# Altium footprint library IC.PcbLib: 386 footprints (part 23 of 30)
Each footprint in its own frame and in the unit in brackets; x right, y up, seen from the top. Pads: shape width x height; smd on the part's side, far side on the other; paste and mask are expansions set on the pad; w line width, h text height; cw(c..) or ccw(c..) is an arc to the next point about the centre after c.
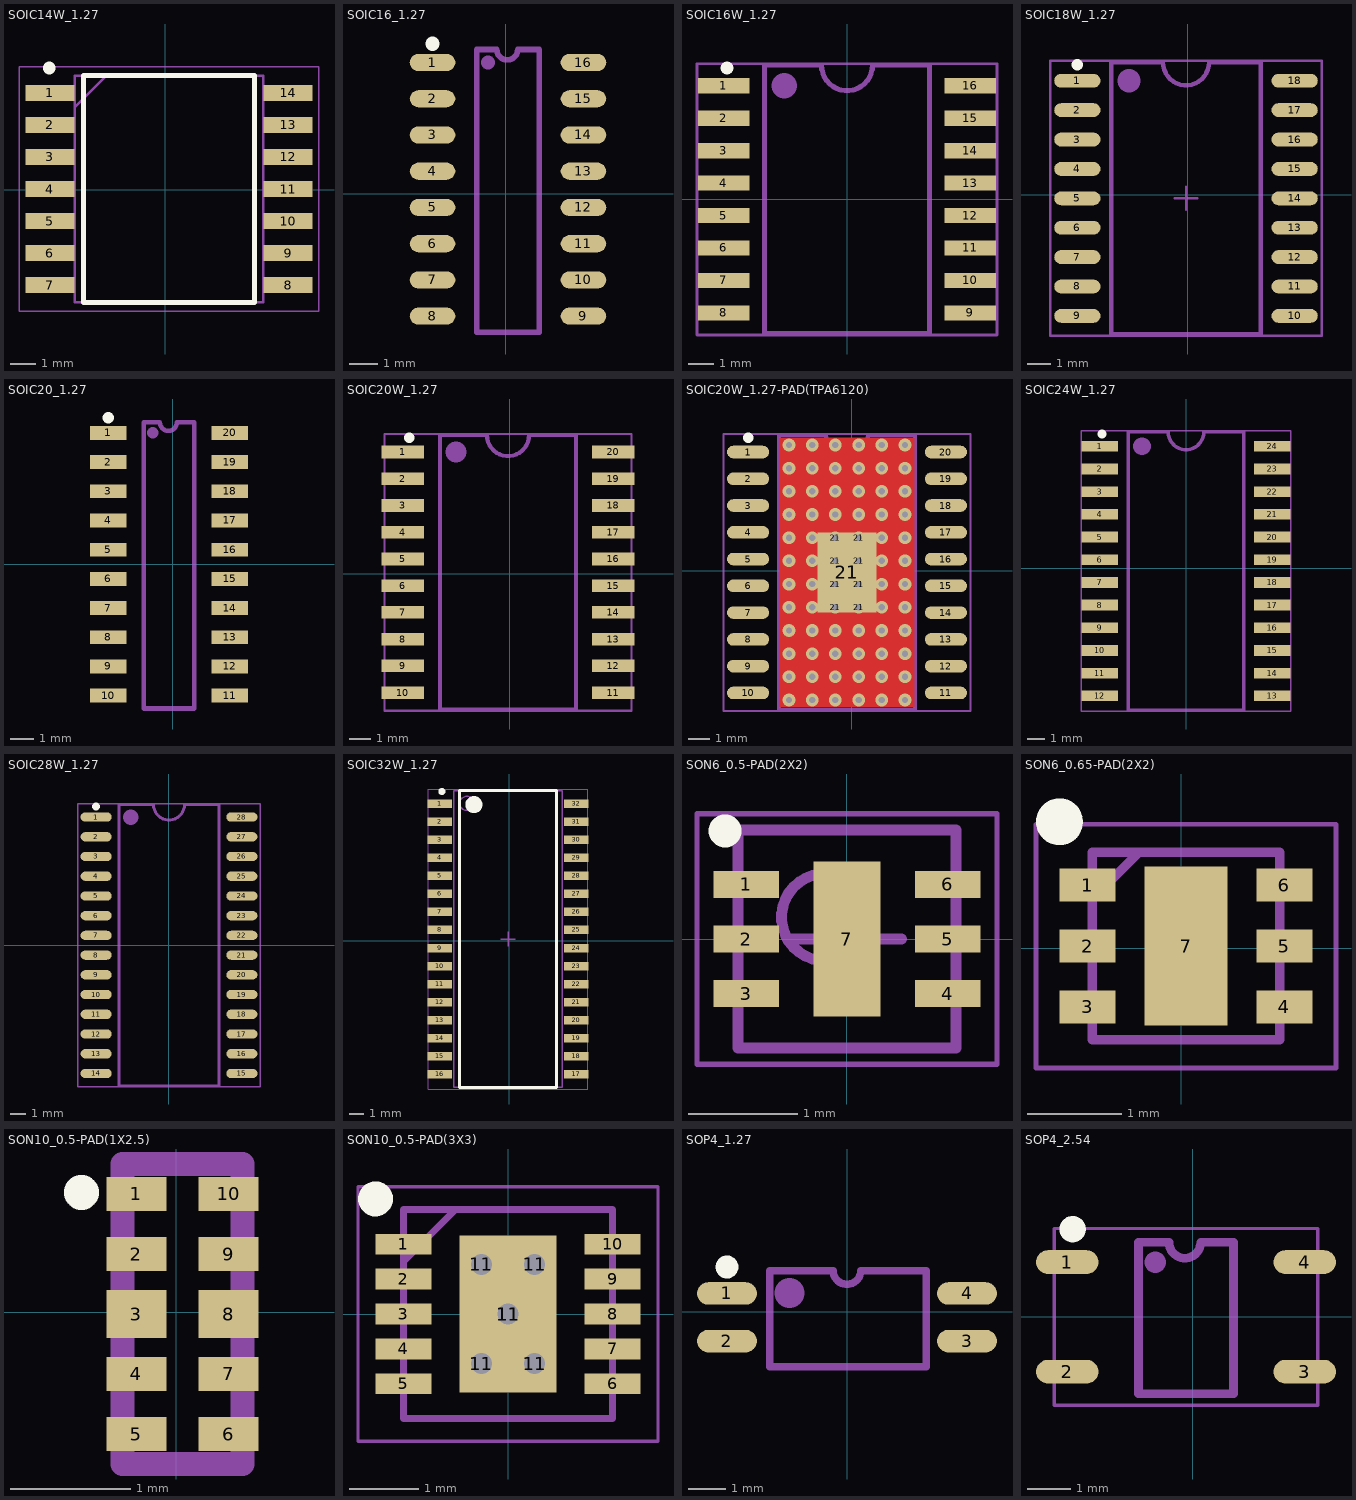
[diagram p22: the footprints below, top view; thin cyan lines are the x and y axes]

## SOIC14W_1.27 [mm]
pads (14):
  rect 1.954x0.65 smd: 1(-4.571,3.835) 2(-4.571,2.565) 3(-4.571,1.295) 4(-4.571,0.025) 5(-4.571,-1.245) 6(-4.571,-2.515) 7(-4.571,-3.785) 8(4.875,-3.785) 9(4.875,-2.515) 10(4.875,-1.245) 11(4.875,0.025) 12(4.875,1.295) 13(4.875,2.565) 14(4.875,3.835)
Top Overlay:
  lines w0.2: -3.244,-4.471 3.548,-4.471 3.548,4.521 -3.244,4.521 -3.244,-4.471
  lines w0.5: -4.597,4.822 -4.597,4.823
Mechanical 13:
  lines w0.1: -3.594,3.251 -2.324,4.521 ; -3.594,-4.471 3.898,-4.471 3.898,4.521 -3.594,4.521 -3.594,-4.471
Mechanical 15:
  lines w0.05: -5.798,-4.823 6.102,-4.823 6.102,4.873 -5.798,4.873 -5.798,-4.823
3D body "LM2574M-3.3_NOPB.stp": height 2.64, standoff 0, extent -5.01,-4.47 5.315,4.521

## SOIC16_1.27 [mm]
pads (16):
  oval 1.6x0.6 smd: 1(-2.569,4.597) 2(-2.569,3.327) 3(-2.569,2.057) 4(-2.569,0.787) 5(-2.569,-0.483) 6(-2.569,-1.753) 7(-2.569,-3.023) 8(-2.569,-4.293) 9(2.721,-4.293) 10(2.721,-3.023) 11(2.721,-1.753) 12(2.721,-0.483) 13(2.721,0.787) 14(2.721,2.057) 15(2.721,3.327) 16(2.721,4.597)
Top Overlay:
  lines w0.5: -2.569,5.258 -2.568,5.257
Mechanical 15:
  lines w0.2: 0.416,5.055 cw(c0.049,5.055) -0.318,5.055 -1.024,5.055 -1.024,-4.851 1.176,-4.851 1.176,5.055 0.443,5.055
  lines w0.5: -0.628,4.598 -0.628,4.597
3D body "SOIC-16-1.STEP": height 1.4, standoff 0, extent -2.908,-4.775 3.092,5.125

## SOIC16W_1.27 [mm]
pads (16):
  rect 2x0.6 smd: 1(-4.822,4.445) 2(-4.822,3.175) 3(-4.822,1.905) 4(-4.822,0.635) 5(-4.822,-0.635) 6(-4.822,-1.905) 7(-4.822,-3.175) 8(-4.822,-4.445) 9(4.822,-4.445) 10(4.822,-3.175) 11(4.822,-1.905) 12(4.822,-0.635) 13(4.822,0.635) 14(4.822,1.905) 15(4.822,3.175) 16(4.822,4.445)
Top Overlay:
  lines w0.5: -4.695,5.131 -4.695,5.132
Mechanical 15:
  lines w0.1: -5.867,-5.309 -5.867,5.309 5.867,5.309 5.867,-5.309 -5.867,-5.309
  lines w0.2: -3.23,-5.25 3.23,-5.25 3.23,5.25 1,5.25 cw(c0,5.25) -1,5.25 -3.23,5.25 -3.23,-5.25
  lines w1: -2.46,4.445 -2.46,4.445
3D body "SOIC16W-1.27.STEP": height 3.5, standoff 0, extent -5.15,-5.1 5.15,5.1

## SOIC18W_1.27 [mm] "SOIC, 18-Leads, Body 11.5x7.5mm, Pitch 1.27mm, IPC Medium Density"
height 2.65
pads (18):
  oval 2x0.6 smd: 1(-4.771,4.928) 2(-4.771,3.658) 3(-4.771,2.388) 4(-4.771,1.118) 5(-4.771,-0.152) 6(-4.771,-1.422) 7(-4.771,-2.692) 8(-4.771,-3.962) 9(-4.771,-5.232) 10(4.619,-5.232) 11(4.619,-3.962) 12(4.619,-2.692) 13(4.619,-1.422) 14(4.619,-0.152) 15(4.619,1.118) 16(4.619,2.388) 17(4.619,3.658) 18(4.619,4.928)
Top Overlay:
  lines w0.5: -4.771,5.613 -4.771,5.614
Mechanical 15:
  lines w0.1: -0.576,-0.152 0.424,-0.152 ; -0.076,-0.652 -0.076,0.348 ; -5.944,-6.096 5.791,-6.096 5.791,5.791 -5.944,5.791 -5.944,-6.096
  lines w0.2: -3.306,-6.037 3.154,-6.037 3.154,5.733 0.924,5.733 cw(c-0.076,5.733) -1.076,5.733 -3.306,5.733 -3.306,-6.037
  lines w1: -2.537,4.927 -2.536,4.928
3D body "SOIC18-300.STEP": height 2.65, standoff 0, extent -5.302,-5.917 4.998,5.613

## SOIC20_1.27 [mm]
pads (20):
  rect 1.6x0.6 smd: 1(-2.797,5.715) 2(-2.797,4.445) 3(-2.797,3.175) 4(-2.797,1.905) 5(-2.797,0.635) 6(-2.797,-0.635) 7(-2.797,-1.905) 8(-2.797,-3.175) 9(-2.797,-4.445) 10(-2.797,-5.715) 11(2.492,-5.715) 12(2.492,-4.445) 13(2.492,-3.175) 14(2.492,-1.905) 15(2.492,-0.635) 16(2.492,0.635) 17(2.492,1.905) 18(2.492,3.175) 19(2.492,4.445) 20(2.492,5.715)
Top Overlay:
  lines w0.5: -2.798,6.375 -2.797,6.375
Mechanical 15:
  lines w0.2: 0.187,6.172 cw(c-0.18,6.172) -0.546,6.172 -1.252,6.172 -1.252,-6.274 0.948,-6.274 0.948,6.172 0.214,6.172
  lines w0.5: -0.857,5.715 -0.856,5.715
3D body "SOIC-16-1.STEP": height 1.4, standoff 0, extent -3.136,-6.197 2.864,3.703
3D body "SOIC-16-1.STEP": height 1.4, standoff 0, extent -3.136,-3.657 2.864,6.243

## SOIC20W_1.27 [mil]
height 104.33
pads (20):
  rect 80x23.62 smd: 1(-199.84,228) 2(-199.84,178) 3(-199.84,128) 4(-199.84,78) 5(-199.84,28) 6(-199.84,-22) 7(-199.84,-72) 8(-199.84,-122) 9(-199.84,-172) 10(-199.84,-222) 11(193.84,-222) 12(193.84,-172) 13(193.84,-122) 14(193.84,-72) 15(193.84,-22) 16(193.84,28) 17(193.84,78) 18(193.84,128) 19(193.84,178) 20(193.84,228)
Top Overlay:
  lines w19.68: -187.85,255 -187.83,255.03
Mechanical 15:
  lines w3.94: -234,-256 -234,262 228,262 228,-256 -234,-256
  lines w7.87: -130.17,258.91 -130.17,-253.69 124.16,-253.69 124.16,258.91 ; -130.17,259.69 -42.37,259.69 ccw(c-3,259.69) 36.37,259.69 124.16,259.69
  lines w39.37: -99.87,227.98 -99.84,228.02
3D body "SOIC20-300.STEP": height 104.33, standoff 0, extent -206.76,-248.98 198.75,254.96

## SOIC20W_1.27-PAD(TPA6120) [mm]
height 2.65
pads (29):
  oval 2x0.6 smd: 1(-4.924,5.639) 2(-4.924,4.369) 3(-4.924,3.099) 4(-4.924,1.829) 5(-4.924,0.559) 6(-4.924,-0.711) 7(-4.924,-1.981) 8(-4.924,-3.251) 9(-4.924,-4.521) 10(-4.924,-5.791) 11(4.466,-5.791) 12(4.466,-4.521) 13(4.466,-3.251) 14(4.466,-1.981) 15(4.466,-0.711) 16(4.466,0.559) 17(4.466,1.829) 18(4.466,3.099) 19(4.466,4.369) 20(4.466,5.639)
  round 0.6 hole 0.3: 21(-0.779,-1.726) 21(-0.779,-0.626) 21(-0.779,0.474) 21(-0.779,1.574) 21(0.321,-1.726) 21(0.321,-0.626) 21(0.321,0.474) 21(0.321,1.574)
  rect 2.79x3.81 smd: 21(-0.229,-0.076)
via 0.321,2.674 diameter 0.6 hole 0.3
via 0.321,3.774 diameter 0.6 hole 0.3
via 0.321,4.874 diameter 0.6 hole 0.3
via 0.321,5.974 diameter 0.6 hole 0.3
via 0.321,-6.126 diameter 0.6 hole 0.3
via 0.321,-5.026 diameter 0.6 hole 0.3
via 0.321,-3.926 diameter 0.6 hole 0.3
via 0.321,-2.826 diameter 0.6 hole 0.3
via -0.779,-2.826 diameter 0.6 hole 0.3
via -0.779,-3.926 diameter 0.6 hole 0.3
via -0.779,-5.026 diameter 0.6 hole 0.3
via -0.779,-6.126 diameter 0.6 hole 0.3
via -0.779,5.974 diameter 0.6 hole 0.3
via -0.779,4.874 diameter 0.6 hole 0.3
via -0.779,3.774 diameter 0.6 hole 0.3
via -0.779,2.674 diameter 0.6 hole 0.3
via 1.421,-0.626 diameter 0.6 hole 0.3
via 1.421,-1.726 diameter 0.6 hole 0.3
via 1.421,-2.826 diameter 0.6 hole 0.3
via 1.421,-3.926 diameter 0.6 hole 0.3
via 1.421,-5.026 diameter 0.6 hole 0.3
via 1.421,-6.126 diameter 0.6 hole 0.3
via 1.421,5.974 diameter 0.6 hole 0.3
via 1.421,4.874 diameter 0.6 hole 0.3
via 1.421,3.774 diameter 0.6 hole 0.3
via 1.421,2.674 diameter 0.6 hole 0.3
via 1.421,1.574 diameter 0.6 hole 0.3
via 1.421,0.474 diameter 0.6 hole 0.3
via 2.521,-0.626 diameter 0.6 hole 0.3
via 2.521,-1.726 diameter 0.6 hole 0.3
via 2.521,-2.826 diameter 0.6 hole 0.3
via 2.521,-3.926 diameter 0.6 hole 0.3
via 2.521,-5.026 diameter 0.6 hole 0.3
via 2.521,-6.126 diameter 0.6 hole 0.3
via 2.521,5.974 diameter 0.6 hole 0.3
via 2.521,4.874 diameter 0.6 hole 0.3
via 2.521,3.774 diameter 0.6 hole 0.3
via 2.521,2.674 diameter 0.6 hole 0.3
via 2.521,1.574 diameter 0.6 hole 0.3
via 2.521,0.474 diameter 0.6 hole 0.3
via -1.879,-0.626 diameter 0.6 hole 0.3
via -1.879,-1.726 diameter 0.6 hole 0.3
via -1.879,-2.826 diameter 0.6 hole 0.3
via -1.879,-3.926 diameter 0.6 hole 0.3
via -1.879,-5.026 diameter 0.6 hole 0.3
via -1.879,-6.126 diameter 0.6 hole 0.3
via -1.879,5.974 diameter 0.6 hole 0.3
via -1.879,4.874 diameter 0.6 hole 0.3
via -1.879,3.774 diameter 0.6 hole 0.3
via -1.879,2.674 diameter 0.6 hole 0.3
via -1.879,1.574 diameter 0.6 hole 0.3
via -1.879,0.474 diameter 0.6 hole 0.3
via -2.979,-0.626 diameter 0.6 hole 0.3
via -2.979,-1.726 diameter 0.6 hole 0.3
via -2.979,-2.826 diameter 0.6 hole 0.3
via -2.979,-3.926 diameter 0.6 hole 0.3
via -2.979,-5.026 diameter 0.6 hole 0.3
via -2.979,-6.126 diameter 0.6 hole 0.3
via -2.979,5.974 diameter 0.6 hole 0.3
via -2.979,4.874 diameter 0.6 hole 0.3
via -2.979,3.774 diameter 0.6 hole 0.3
via -2.979,2.674 diameter 0.6 hole 0.3
via -2.979,1.574 diameter 0.6 hole 0.3
via -2.979,0.474 diameter 0.6 hole 0.3
Top Layer:
  rectangle: -3.429,-6.476 2.971,6.324
Top Overlay:
  lines w0.5: -4.924,6.325 -4.923,6.325
Mechanical 15:
  lines w0.1: -6.096,-6.655 5.639,-6.655 5.639,6.502 -6.096,6.502 -6.096,-6.655
  lines w0.2: -3.459,6.424 -3.459,-6.596 3.001,-6.596 3.001,6.424 ; -3.459,6.444 -1.229,6.444 ccw(c-0.229,6.444) 0.771,6.444 3.001,6.444
  lines w1: -2.689,5.638 -2.688,5.639
3D body "SOIC20-300.STEP": height 2.65, standoff 0, extent -5.404,-6.476 4.896,6.324

## SOIC24W_1.27 [mil]
height 10
pads (24):
  rect 80x23.62 smd: 1(-189.84,269) 2(-189.84,219) 3(-189.84,169) 4(-189.84,119) 5(-189.84,69) 6(-189.84,19) 7(-189.84,-31) 8(-189.84,-81) 9(-189.84,-131) 10(-189.84,-181) 11(-189.84,-231) 12(-189.84,-281) 13(189.84,-281) 14(189.84,-231) 15(189.84,-181) 16(189.84,-131) 17(189.84,-81) 18(189.84,-31) 19(189.84,19) 20(189.84,69) 21(189.84,119) 22(189.84,169) 23(189.84,219) 24(189.84,269)
Top Overlay:
  lines w19.68: -184.85,296 -184.83,296.03
Mechanical 15:
  lines w3.94: -231,-315 231,-315 231,303 -231,303 -231,-315
  lines w7.87: -127.17,-312.69 127.16,-312.69 127.16,300.69 39.37,300.69 cw(c0,300.69) -39.37,300.69 -127.17,300.69 -127.17,-312.69
  lines w39.37: -96.87,268.98 -96.84,269.02
3D body "SOIC24.STEP": height 104.33, standoff 0, extent -204.33,-311.12 201.18,299.11

## SOIC28W_1.27 [mm]
height 2.64
pads (28):
  oval 2x0.6 smd: 1(-4.695,8.255) 2(-4.695,6.985) 3(-4.695,5.715) 4(-4.695,4.445) 5(-4.695,3.175) 6(-4.695,1.905) 7(-4.695,0.635) 8(-4.695,-0.635) 9(-4.695,-1.905) 10(-4.695,-3.175) 11(-4.695,-4.445) 12(-4.695,-5.715) 13(-4.695,-6.985) 14(-4.695,-8.255) 15(4.695,-8.255) 16(4.695,-6.985) 17(4.695,-5.715) 18(4.695,-4.445) 19(4.695,-3.175) 20(4.695,-1.905) 21(4.695,-0.635) 22(4.695,0.635) 23(4.695,1.905) 24(4.695,3.175) 25(4.695,4.445) 26(4.695,5.715) 27(4.695,6.985) 28(4.695,8.255)
Top Overlay:
  lines w0.5: -4.695,8.941 -4.695,8.942
Mechanical 15:
  lines w0.1: -5.867,-9.119 -5.867,9.119 5.867,9.119 5.867,-9.119 -5.867,-9.119
  lines w0.2: -3.23,-9.06 -3.23,9.06 -1,9.06 ccw(c0,9.06) 1,9.06 3.23,9.06 3.23,-9.06 -3.23,-9.06
  lines w1: -2.46,8.255 -2.46,8.255
3D body "SOIC28-300.STEP": height 2.65, standoff 0, extent -5.15,-8.95 5.15,8.95

## SOIC32W_1.27 [mm]
pads (32):
  rect 1.7x0.6 smd: 1(-4.904,9.652) 2(-4.904,8.382) 3(-4.904,7.112) 4(-4.904,5.842) 5(-4.904,4.572) 6(-4.904,3.302) 7(-4.904,2.032) 8(-4.904,0.762) 9(-4.904,-0.508) 10(-4.904,-1.778) 11(-4.904,-3.048) 12(-4.904,-4.318) 13(-4.904,-5.588) 14(-4.904,-6.858) 15(-4.904,-8.128) 16(-4.904,-9.398) 17(4.701,-9.398) 18(4.701,-8.128) 19(4.701,-6.858) 20(4.701,-5.588) 21(4.701,-4.318) 22(4.701,-3.048) 23(4.701,-1.778) 24(4.701,-0.508) 25(4.701,0.762) 26(4.701,2.032) 27(4.701,3.302) 28(4.701,4.572) 29(4.701,5.842) 30(4.701,7.112) 31(4.701,8.382) 32(4.701,9.652)
Top Overlay:
  circle w0.25: c-4.752,10.502 r0.125
  circle w0.6: c-2.502,9.577 r0.3
  lines w0.2: -3.502,-10.323 -3.502,10.577 3.298,10.577 3.298,-10.323 -3.502,-10.323
Mechanical 13:
  circle w0.1: c-3.002,9.667 r0.5
  lines w0.1: -3.902,-10.313 -3.902,10.567 3.698,10.567 3.698,-10.313 -3.902,-10.313
Mechanical 15:
  lines w0.05: -5.702,-10.423 -5.702,10.677 5.498,10.677 5.498,-10.423 -5.702,-10.423
  lines w0.1: -0.602,0.127 0.398,0.127 ; -0.102,-0.373 -0.102,0.627
3D body "SOIC127P1030X265-32N.step": height 2.65, standoff 0, extent -5.226,-10.273 5.074,10.527

## SON6_0.5-PAD(2X2) [mm]
pads (7):
  rect 0.6x0.25 smd mask+0.102: 1(-0.925,0.5) 2(-0.925,0) 4(0.925,-0.5) 5(0.925,0)
  rect 0.6x0.25 smd paste+0 mask+0.102: 3(-0.925,-0.5)
  rect 0.6x0.25 smd: 6(0.925,0.5)
  rect 0.61x1.42 smd: 7(0,0)
Top Overlay:
  circle w0.25: c-1.118,0.991 r0.025
Mechanical 13:
  circle w0.1: c-0.2,0.2 r0.4
  lines w0.1: -1,-1 1,-1 1,1 -1,1 -1,-1
Mechanical 15:
  lines w0.05: -1.375,-1.15 1.375,-1.15 1.375,1.15 -1.375,1.15 -1.375,-1.15
  lines w0.1: -0.5,0 0.5,0 ; 0,-0.5 0,0.5
3D body "LTC3025EDC#TRMPBF.stp": height 0.8, standoff 0, extent -1.05,-1 1.05,1

## SON6_0.65-PAD(2X2) [mm]
pads (7):
  rect 0.6x0.35 smd: 1(-0.999,0.675) 2(-0.999,0.025) 3(-0.999,-0.625) 4(1.101,-0.625) 5(1.101,0.025) 6(1.101,0.675)
  rect 0.889x1.7 smd: 7(0.051,0.025)
Top Overlay:
  circle w0.25: c-1.299,1.35 r0.125
Mechanical 13:
  lines w0.1: -0.949,0.525 -0.449,1.025 ; -0.949,-0.975 1.051,-0.975 1.051,1.025 -0.949,1.025 -0.949,-0.975
Mechanical 15:
  lines w0.05: -1.549,-1.275 1.651,-1.275 1.651,1.325 -1.549,1.325 -1.549,-1.275
3D body "TPS61170DRVT.stp": height 0.8, standoff 0, extent -0.999,-0.975 1.101,1.025

## SON10_0.5-PAD(1X2.5) [mm]
pads (10):
  rect 0.5x0.28 smd: 1(-0.334,0.987) 2(-0.334,0.487) 4(-0.334,-0.513) 5(-0.334,-1.013) 6(0.436,-1.013) 7(0.436,-0.513) 9(0.436,0.487) 10(0.436,0.987)
  rect 0.5x0.4 smd: 3(-0.334,-0.013) 8(0.436,-0.013)
Top Overlay:
  circle w0.254: c-0.791,1 r0.019
Mechanical 13:
  lines w0.2: -0.449,-1.263 -0.449,1.237 0.551,1.237 0.551,-1.263 -0.449,-1.263
3D body: height 0.61, standoff 0.1, extent -0.377,0.765 -0.078,1.064
3D body: height 0.6, standoff 0, extent -0.457,-1.27 0.559,1.27

## SON10_0.5-PAD(3X3) [mm]
pads (16):
  rect 0.8x0.3 smd: 1(-1.5,1) 2(-1.5,0.5) 3(-1.5,0) 4(-1.5,-0.5) 5(-1.5,-1) 6(1.5,-1) 7(1.5,-0.5) 8(1.5,0) 9(1.5,0.5) 10(1.5,1)
  round 0.6 hole 0.3: 11(-0.381,-0.711) 11(-0.381,0.711) 11(0,0) 11(0.381,-0.711) 11(0.381,0.711)
  rect 1.397x2.25 smd: 11(0,0)
Top Overlay:
  circle w0.25: c-1.9,1.65 r0.125
Mechanical 13:
  lines w0.1: -1.5,0.75 -0.75,1.5 ; -1.5,-1.5 -1.5,1.5 1.5,1.5 1.5,-1.5 -1.5,-1.5
Mechanical 15:
  lines w0.05: -2.15,-1.825 -2.15,1.825 2.15,1.825 2.15,-1.825 -2.15,-1.825
3D body "TPS63060DSCT.stp": height 0.8, standoff 0, extent -1.55,-1.5 1.55,1.5

## SOP4_1.27 [mm]
pads (4):
  oval 1.6x0.6 smd: 1(-3.2,0.483) 2(-3.2,-0.787) 3(3.2,-0.787) 4(3.2,0.483)
Top Overlay:
  circle w0.305: c-3.2,1.189 r0.152
Mechanical 15:
  lines w0.2: -2.057,1.092 -2.057,-1.473 2.108,-1.473 2.108,1.092 ; -2.057,1.092 -0.368,1.092 ccw(c-0.001,1.092) 0.366,1.092 ; 0.393,1.092 2.109,1.092
  lines w0.8: -1.534,0.498 -1.533,0.497
3D body "SOP-4-1.STEP": height 2.1, standoff 0, extent -3.509,-1.552 3.491,1.248

## SOP4_2.54 [mm]
pads (4):
  oval 1.45x0.55 smd: 1(-2.902,1.27) 2(-2.902,-1.27) 4(2.598,1.27)
  oval 1.45x0.55 smd paste+0: 3(2.598,-1.27)
Top Overlay:
  circle w0.305: c-2.778,2.032 r0.152
Mechanical 15:
  lines w0.076: -3.202,-2.05 2.898,-2.05 2.898,2.05 -3.202,2.05 -3.202,-2.05
  lines w0.2: 0.187,1.727 cw(c-0.18,1.727) -0.546,1.727 -1.252,1.727 -1.252,-1.778 0.948,-1.778 0.948,1.727 0.214,1.727
  lines w0.5: -0.864,1.27 -0.863,1.27
3D body "SOP4-2.54B.STEP": height 2.1, standoff 0, extent -3.656,-1.925 3.351,1.925